# Altium footprint library ADP_Connector.PcbLib: 49 footprints (part 4 of 4)
Each footprint in its own frame and in the unit in brackets; x right, y up, seen from the top. Pads: shape width x height; smd on the part's side, far side on the other; paste and mask are expansions set on the pad; w line width, h text height; cw(c..) or ccw(c..) is an arc to the next point about the centre after c.
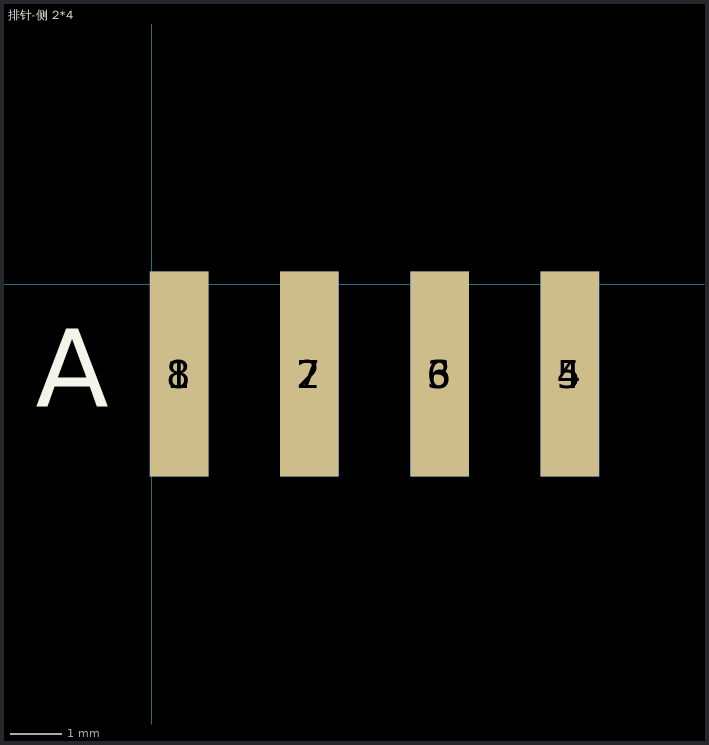
[diagram p3: the footprint, top view; thin cyan lines are the x and y axes]

## 排针-侧 2*4 [mil]
pads (8):
  rect 45x157 smd: 1(21.06,-68.84) 2(121.06,-68.84) 3(221.06,-68.84) 4(321.06,-68.84)
  rect 45x157 smd far side: 5(321.06,-68.84) 6(221.06,-68.84) 7(121.06,-68.84) 8(21.06,-68.84)
Top Overlay:
  text "A" at -88.94,-93.84 h60
Bottom Overlay:
  text "B" at 396.06,-88.84 h60